# Altium integrated library Rotary_Switches_rev15a.intlib: 52 symbols
Pins are listed as number, name and electrical type; pins without a type are passive.

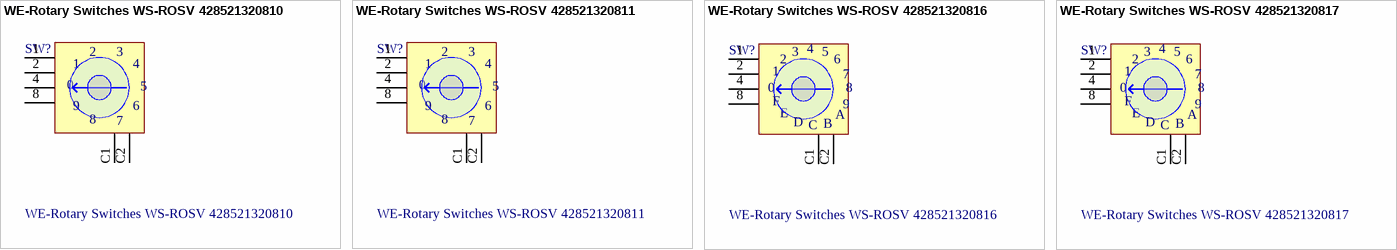
[diagram p0: symbols WE-Rotary Switches WS-ROSV 428521320810 to WE-Rotary Switches WS-ROSV 428521320817]

## WE-Rotary Switches WS-ROSV 428521320810
designator SW?
WS-ROSV SMD Rotary Switch 10x10 mm; Manufacturer: Würth Elektronik eiSos GmbH & Co.KG; ComponentLink1 Description: Manufacturer; ComponentLink2 Description: Datasheet; Creat by: Karrer Zheng; NoPins: 06; Creat Date: 20 March February 2014; partNo: 428521320810; ComponentLink1URL: http://www.we-online.com; ComponentLink2URL: http://katalog.we-online.de/em/datasheet/428521320810.pdf
footprint 428521320810 (10 position, 2.54mm Pitch, Horizontal type, SMD, Round Arrow type, light grey actuator, real code, T&R)
pins: 1, 2, 4, 8, C1, C2
text: 3; 0; 5; 9; 6; 7

## WE-Rotary Switches WS-ROSV 428521320811
designator SW?
WS-ROSV SMD Rotary Switch 10x10 mm; Manufacturer: Würth Elektronik eiSos GmbH & Co.KG; ComponentLink1 Description: Manufacturer; ComponentLink2 Description: Datasheet; Creat by: Karrer Zheng; NoPins: 06; Creat Date: 20 March February 2014; partNo: 428521320811; ComponentLink1URL: http://www.we-online.com; ComponentLink2URL: http://katalog.we-online.de/em/datasheet/428521320811.pdf
footprint 428521320811 (10 position, 2.54mm Pitch, Horizontal type, SMD, Round Arrow type, blue actuator, complement code, T&R)
pins: 1, 2, 4, 8, C1, C2
text: 3; 0; 5; 9; 6; 7

## WE-Rotary Switches WS-ROSV 428521320816
designator SW?
WS-ROSV SMD Rotary Switch 10x10 mm; Manufacturer: Würth Elektronik eiSos GmbH & Co.KG; ComponentLink1 Description: Manufacturer; ComponentLink2 Description: Datasheet; Creat by: Karrer Zheng; NoPins: 06; Creat Date: 20 March February 2014; partNo: 428521320816; ComponentLink1URL: http://www.we-online.com; ComponentLink2URL: http://katalog.we-online.de/em/datasheet/428521320816.pdf
footprint 428521320816 (16 position, 2.54mm Pitch, Horizontal type, SMD, Round Arrow)
pins: 1, 2, 4, 8, C1, C2
text: 3; 5; 6; 7; 0; F; 9; E; A; D; C; B

## WE-Rotary Switches WS-ROSV 428521320817
designator SW?
WS-ROSV SMD Rotary Switch 10x10 mm; Manufacturer: Würth Elektronik eiSos GmbH & Co.KG; ComponentLink1 Description: Manufacturer; ComponentLink2 Description: Datasheet; Creat by: Karrer Zheng; NoPins: 06; Creat Date: 20 March February 2014; partNo: 428521320817; ComponentLink1URL: http://www.we-online.com; ComponentLink2URL: http://katalog.we-online.de/em/datasheet/428521320817.pdf
footprint 428521320817 (16 position, 2.54mm Pitch, Horizontal type, SMD, Round Arrow type, blue actuator, complement code, T&R)
pins: 1, 2, 4, 8, C1, C2
text: 3; 5; 6; 7; 0; F; 9; E; A; D; C; B


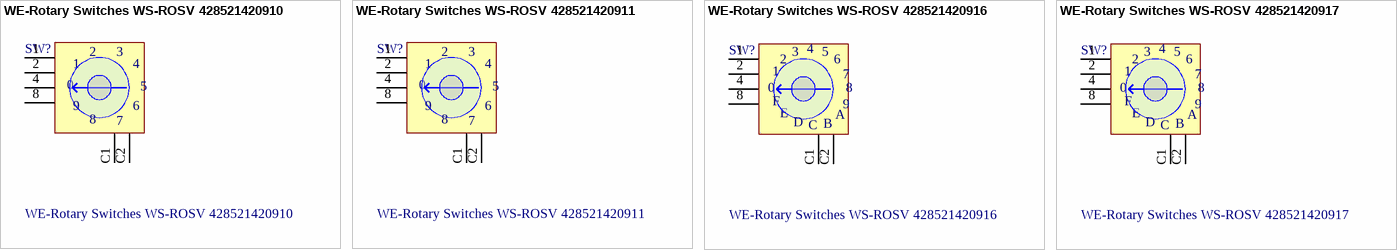
[diagram p1: symbols WE-Rotary Switches WS-ROSV 428521420910 to WE-Rotary Switches WS-ROSV 428521420917]

## WE-Rotary Switches WS-ROSV 428521420910
designator SW?
WS-ROSV SMD Rotary Switch 10x10 mm; Manufacturer: Würth Elektronik eiSos GmbH & Co.KG; ComponentLink1 Description: Manufacturer; ComponentLink2 Description: Datasheet; Creat by: Karrer Zheng; NoPins: 06; Creat Date: 20 March February 2014; partNo: 428521420910; ComponentLink1URL: http://www.we-online.com; ComponentLink2URL: http://katalog.we-online.de/em/datasheet/428521420910.pdf
footprint 428521420910 (10 position, 2.54mm Pitch, Horizontal type, SMD, Round Shaft type, light grey actuator, real code, Tube)
pins: 1, 2, 4, 8, C1, C2
text: 3; 0; 5; 9; 6; 7

## WE-Rotary Switches WS-ROSV 428521420911
designator SW?
WS-ROSV SMD Rotary Switch 10x10 mm; Manufacturer: Würth Elektronik eiSos GmbH & Co.KG; ComponentLink1 Description: Manufacturer; ComponentLink2 Description: Datasheet; Creat by: Karrer Zheng; NoPins: 06; Creat Date: 20 March February 2014; partNo: 428521420911; ComponentLink1URL: http://www.we-online.com; ComponentLink2URL: http://katalog.we-online.de/em/datasheet/428521420911.pdf
footprint 428521420911 (10 position, 2.54mm Pitch, Horizontal type, SMD, Round Shaft type, blue actuator, complement code,Tube)
pins: 1, 2, 4, 8, C1, C2
text: 3; 0; 5; 9; 6; 7

## WE-Rotary Switches WS-ROSV 428521420916
designator SW?
WS-ROSV SMD Rotary Switch 10x10 mm; Manufacturer: Würth Elektronik eiSos GmbH & Co.KG; ComponentLink1 Description: Manufacturer; ComponentLink2 Description: Datasheet; Creat by: Karrer Zheng; NoPins: 06; Creat Date: 20 March February 2014; partNo: 428521420916; ComponentLink1URL: http://www.we-online.com; ComponentLink2URL: http://katalog.we-online.de/em/datasheet/428521420916.pdf
footprint 428521420916 (16 position, 2.54mm Pitch, Horizontal type, SMD, Round Shaft type, light grey actuator, real code, Tube)
pins: 1, 2, 4, 8, C1, C2
text: 3; 5; 6; 7; 0; F; 9; E; A; D; C; B

## WE-Rotary Switches WS-ROSV 428521420917
designator SW?
WS-ROSV SMD Rotary Switch 10x10 mm; Manufacturer: Würth Elektronik eiSos GmbH & Co.KG; ComponentLink1 Description: Manufacturer; ComponentLink2 Description: Datasheet; Creat by: Karrer Zheng; NoPins: 06; Creat Date: 20 March February 2014; partNo: 428521420917; ComponentLink1URL: http://www.we-online.com; ComponentLink2URL: http://katalog.we-online.de/em/datasheet/428521420917.pdf
footprint 428521420917 (16 position, 2.54mm Pitch, Horizontal type, SMD, Round Shaft type, blue actuator, complement code, Tube)
pins: 1, 2, 4, 8, C1, C2
text: 3; 5; 6; 7; 0; F; 9; E; A; D; C; B


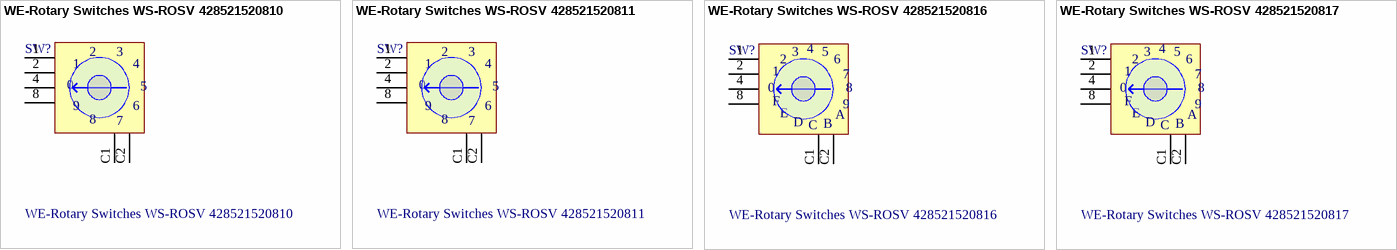
[diagram p2: symbols WE-Rotary Switches WS-ROSV 428521520810 to WE-Rotary Switches WS-ROSV 428521520817]

## WE-Rotary Switches WS-ROSV 428521520810
designator SW?
WS-ROSV SMD Rotary Switch 10x10 mm; Manufacturer: Würth Elektronik eiSos GmbH & Co.KG; ComponentLink1 Description: Manufacturer; ComponentLink2 Description: Datasheet; Creat by: Karrer Zheng; NoPins: 06; Creat Date: 20 March February 2014; partNo: 428521520810; ComponentLink1URL: http://www.we-online.com; ComponentLink2URL: http://katalog.we-online.de/em/datasheet/428521520810.pdf
footprint 428521520810 (10 position, 2.54mm Pitch, Horizontal type, SMD, Round Cross type, light grey actuator, real code, T&R)
pins: 1, 2, 4, 8, C1, C2
text: 3; 0; 5; 9; 6; 7

## WE-Rotary Switches WS-ROSV 428521520811
designator SW?
WS-ROSV SMD Rotary Switch 10x10 mm; Manufacturer: Würth Elektronik eiSos GmbH & Co.KG; ComponentLink1 Description: Manufacturer; ComponentLink2 Description: Datasheet; Creat by: Karrer Zheng; NoPins: 06; Creat Date: 20 March February 2014; partNo: 428521520811; ComponentLink1URL: http://www.we-online.com; ComponentLink2URL: http://katalog.we-online.de/em/datasheet/428521520811.pdf
footprint 428521520811 (10 position, 2.54mm Pitch, Horizontal type, SMD, Round Cross type, blue actuator, complement code, T&R)
pins: 1, 2, 4, 8, C1, C2
text: 3; 0; 5; 9; 6; 7

## WE-Rotary Switches WS-ROSV 428521520816
designator SW?
WS-ROSV SMD Rotary Switch 10x10 mm; Manufacturer: Würth Elektronik eiSos GmbH & Co.KG; ComponentLink1 Description: Manufacturer; ComponentLink2 Description: Datasheet; Creat by: Karrer Zheng; NoPins: 06; Creat Date: 20 March February 2014; partNo: 428521520816; ComponentLink1URL: http://www.we-online.com; ComponentLink2URL: http://katalog.we-online.de/em/datasheet/428521520816.pdf
footprint 428521520816 (16 position, 2.54mm Pitch, Horizontal type, SMD, Round Cross type, light grey actuator, real code, T&R)
pins: 1, 2, 4, 8, C1, C2
text: 3; 5; 6; 7; 0; F; 9; E; A; D; C; B

## WE-Rotary Switches WS-ROSV 428521520817
designator SW?
WS-ROSV SMD Rotary Switch 10x10 mm; Manufacturer: Würth Elektronik eiSos GmbH & Co.KG; ComponentLink1 Description: Manufacturer; ComponentLink2 Description: Datasheet; Creat by: Karrer Zheng; NoPins: 06; Creat Date: 20 March February 2014; partNo: 428521520817; ComponentLink1URL: http://www.we-online.com; ComponentLink2URL: http://katalog.we-online.de/em/datasheet/428521520817.pdf
footprint 428521520817 (16 position, 2.54mm Pitch, Horizontal type, SMD, Round Cross type, blue actuator, complement code, T&R)
pins: 1, 2, 4, 8, C1, C2
text: 3; 5; 6; 7; 0; F; 9; E; A; D; C; B


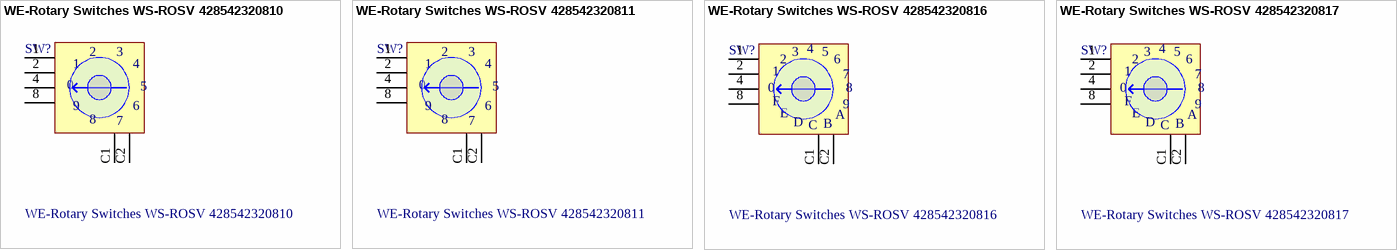
[diagram p3: symbols WE-Rotary Switches WS-ROSV 428542320810 to WE-Rotary Switches WS-ROSV 428542320817]

## WE-Rotary Switches WS-ROSV 428542320810
designator SW?
WS-ROSV SMD Rotary Switch 7 x 7 mm; Manufacturer: Würth Elektronik eiSos GmbH & Co.KG; ComponentLink1 Description: Manufacturer; ComponentLink2 Description: Datasheet; Creat by: Karrer Zheng; NoPins: 06; Creat Date: 24 March 2014; partNo: 428542320810; ComponentLink1URL: http://www.we-online.com; ComponentLink2URL: http://katalog.we-online.de/em/datasheet/428542320810.pdf
footprint 428542320810 (7*7mm, 10 position, 2.54mm Pitch, Horizontal type, SMD, Round Arrow type, red actuator, real code, T&R)
pins: 1, 2, 4, 8, C1, C2
text: 3; 0; 5; 9; 6; 7

## WE-Rotary Switches WS-ROSV 428542320811
designator SW?
WS-ROSV SMD Rotary Switch 7 x 7 mm; Manufacturer: Würth Elektronik eiSos GmbH & Co.KG; ComponentLink1 Description: Manufacturer; ComponentLink2 Description: Datasheet; Creat by: Karrer Zheng; NoPins: 06; Creat Date: 24 March 2014; partNo: 428542320811; ComponentLink1URL: http://www.we-online.com; ComponentLink2URL: http://katalog.we-online.de/em/datasheet/428542320811.pdf
footprint 428542320811 (7*7mm, 10 position, 2.54mm, horizontal type, SMD, Round  Arrow type, orange actuator, complement code, T&R)
pins: 1, 2, 4, 8, C1, C2
text: 3; 0; 5; 9; 6; 7

## WE-Rotary Switches WS-ROSV 428542320816
designator SW?
WS-ROSV SMD Rotary Switch 7 x 7 mm; Manufacturer: Würth Elektronik eiSos GmbH & Co.KG; ComponentLink1 Description: Manufacturer; ComponentLink2 Description: Datasheet; Creat by: Karrer Zheng; NoPins: 06; Creat Date: 24 March 2014; partNo: 428542320816; ComponentLink1URL: http://www.we-online.com; ComponentLink2URL: http://katalog.we-online.de/em/datasheet/428542320816.pdf
footprint 428542320816 (7*7mm, 16 position, 2.54mm, horizontal type, SMD, Round  Arrow type, light grey actuator, real code, T&R)
pins: 1, 2, 4, 8, C1, C2
text: 3; 5; 6; 7; 0; F; 9; E; A; D; C; B

## WE-Rotary Switches WS-ROSV 428542320817
designator SW?
WS-ROSV SMD Rotary Switch 7 x 7 mm; Manufacturer: Würth Elektronik eiSos GmbH & Co.KG; ComponentLink1 Description: Manufacturer; ComponentLink2 Description: Datasheet; Creat by: Karrer Zheng; NoPins: 06; Creat Date: 24 March 2014; partNo: 428542320817; ComponentLink1URL: http://www.we-online.com; ComponentLink2URL: http://katalog.we-online.de/em/datasheet/428542320817.pdf
footprint 428542320817 (7*7mm, 16 position, 2.54mm Pitch, Horizontal type, SMD, Round Arrow type, ivory actuator, complement code, T&R)
pins: 1, 2, 4, 8, C1, C2
text: 3; 5; 6; 7; 0; F; 9; E; A; D; C; B


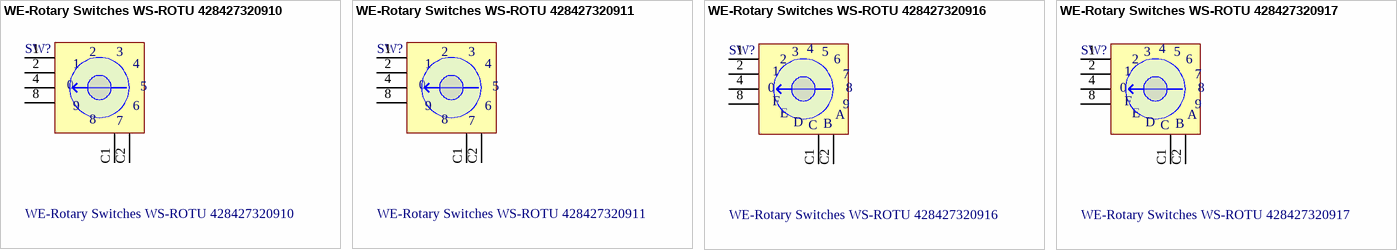
[diagram p4: symbols WE-Rotary Switches WS-ROTU 428427320910 to WE-Rotary Switches WS-ROTU 428427320917]

## WE-Rotary Switches WS-ROTU 428427320910
designator SW?
WS-ROTU THT Rotary Switch 10x10 mm right angle, 2.54 mm Pitch; Manufacturer: Würth Elektronik eiSos GmbH & Co.KG; ComponentLink1 Description: Manufacturer; ComponentLink2 Description: Datasheet; Creat by: Karrer Zheng; NoPins: 06; Creat Date: 24 March 2014; partNo: 428427320910; ComponentLink1URL: http://www.we-online.com; ComponentLink2URL: http://katalog.we-online.de/em/datasheet/428427320910.pdf
footprint 428427320910 (10 position, 2,54mm Pitch, Right Angled type, THT, Round Arrow type, dark grey actuator,real code, Tube)
pins: 1, 2, 4, 8, C1, C2
text: 3; 0; 5; 9; 6; 7

## WE-Rotary Switches WS-ROTU 428427320911
designator SW?
WS-ROTU THT Rotary Switch 10x10 mm right angle,2.54  mm Pitch; Manufacturer: Würth Elektronik eiSos GmbH & Co.KG; ComponentLink1 Description: Manufacturer; ComponentLink2 Description: Datasheet; Creat by: Karrer Zheng; NoPins: 06; Creat Date: 24 March 2014; partNo: 428427320911; ComponentLink1URL: http://www.we-online.com; ComponentLink2URL: http://katalog.we-online.de/em/datasheet/428427320911.pdf
footprint 428427320911 (10 position, 2,54mm Pitch, Right Angled type, THT, Round Arrow type, ivory actuator,complement code, Tube)
pins: 1, 2, 4, 8, C1, C2
text: 3; 0; 5; 9; 6; 7

## WE-Rotary Switches WS-ROTU 428427320916
designator SW?
WS-ROTU THT Rotary Switch 10x10 mm right angle,2.54 mm Pitch; Manufacturer: Würth Elektronik eiSos GmbH & Co.KG; ComponentLink1 Description: Manufacturer; ComponentLink2 Description: Datasheet; Creat by: Karrer Zheng; NoPins: 06; Creat Date: 24 March 2014; partNo: 428427320916; ComponentLink1URL: http://www.we-online.com; ComponentLink2URL: http://katalog.we-online.de/em/datasheet/428427320916.pdf
footprint 428427320916 (16 position, 2,54mm Pitch, Right Angled type, THT, Round Arrow type, dark grey actuator,real code, Tube)
pins: 1, 2, 4, 8, C1, C2
text: 3; 5; 6; 7; 0; F; 9; E; A; D; C; B

## WE-Rotary Switches WS-ROTU 428427320917
designator SW?
WS-ROTU THT Rotary Switch 10x10 mm right angle,2.54 mm Pitch; Manufacturer: Würth Elektronik eiSos GmbH & Co.KG; ComponentLink1 Description: Manufacturer; ComponentLink2 Description: Datasheet; Creat by: Karrer Zheng; NoPins: 06; Creat Date: 24 March 2014; partNo: 428427320917; ComponentLink1URL: http://www.we-online.com; ComponentLink2URL: http://katalog.we-online.de/em/datasheet/428427320917.pdf
footprint 428427320917 (16 position, 2,54mm Pitch, Right Angled type, THT, Round Arrow type, ivory actuator,complement code, Tube)
pins: 1, 2, 4, 8, C1, C2
text: 3; 5; 6; 7; 0; F; 9; E; A; D; C; B


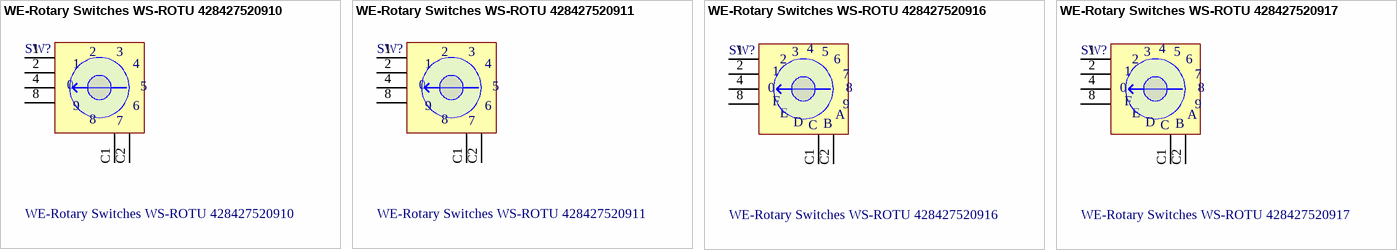
[diagram p5: symbols WE-Rotary Switches WS-ROTU 428427520910 to WE-Rotary Switches WS-ROTU 428427520917]

## WE-Rotary Switches WS-ROTU 428427520910
designator SW?
WS-ROTU THT Rotary Switch 10x10 mm right angle, 2.54 mm Pitch; Manufacturer: Würth Elektronik eiSos GmbH & Co.KG; ComponentLink1 Description: Manufacturer; ComponentLink2 Description: Datasheet; Creat by: Karrer Zheng; NoPins: 06; Creat Date: 24 March 2014; partNo: 428427520910; ComponentLink1URL: http://www.we-online.com; ComponentLink2URL: http://katalog.we-online.de/em/datasheet/428427520910.pdf
footprint 428427520910 (10 position, 2,54mm Pitch, Right Angled type, THT, Round Cross type, dark grey actuator,real code, Tube)
pins: 1, 2, 4, 8, C1, C2
text: 3; 0; 5; 9; 6; 7

## WE-Rotary Switches WS-ROTU 428427520911
designator SW?
WS-ROTU THT Rotary Switch 10x10 mm right angle, 2.54 mm Pitch; Manufacturer: Würth Elektronik eiSos GmbH & Co.KG; ComponentLink1 Description: Manufacturer; ComponentLink2 Description: Datasheet; Creat by: Karrer Zheng; NoPins: 06; Creat Date: 24 March 2014; partNo: 428427520911; ComponentLink1URL: http://www.we-online.com; ComponentLink2URL: http://katalog.we-online.de/em/datasheet/428427520911.pdf
footprint 428427520911 (10 position, 2,54mm Pitch, Right Angled type, THT, Round Cross type, ivory actuator,complement code, Tube)
pins: 1, 2, 4, 8, C1, C2
text: 3; 0; 5; 9; 6; 7

## WE-Rotary Switches WS-ROTU 428427520916
designator SW?
WS-ROTU THT Rotary Switch 10x10 mm right angle, 2.54 mm Pitch; Manufacturer: Würth Elektronik eiSos GmbH & Co.KG; ComponentLink1 Description: Manufacturer; ComponentLink2 Description: Datasheet; Creat by: Karrer Zheng; NoPins: 06; Creat Date: 24 March 2014; partNo: 428427520916; ComponentLink1URL: http://www.we-online.com; ComponentLink2URL: http://katalog.we-online.de/em/datasheet/428427520916.pdf
footprint 428427520916 (16 position, 2,54mm Pitch, Right Angled type, THT, Round Cross type, dark grey actuator,real code, Tube)
pins: 1, 2, 4, 8, C1, C2
text: 3; 5; 6; 7; 0; F; 9; E; A; D; C; B

## WE-Rotary Switches WS-ROTU 428427520917
designator SW?
WS-ROTU THT Rotary Switch 10x10 mm right angle, 2.54 mm Pitch; Manufacturer: Würth Elektronik eiSos GmbH & Co.KG; ComponentLink1 Description: Manufacturer; ComponentLink2 Description: Datasheet; Creat by: Karrer Zheng; NoPins: 06; Creat Date: 24 March 2014; partNo: 428427520917; ComponentLink1URL: http://www.we-online.com; ComponentLink2URL: http://katalog.we-online.de/em/datasheet/428427520917.pdf
footprint 428427520917 (16 position, 2,54mm Pitch, Right Angled type, THT, Round Cross type, ivory actuator,complement code, Tube)
pins: 1, 2, 4, 8, C1, C2
text: 3; 5; 6; 7; 0; F; 9; E; A; D; C; B


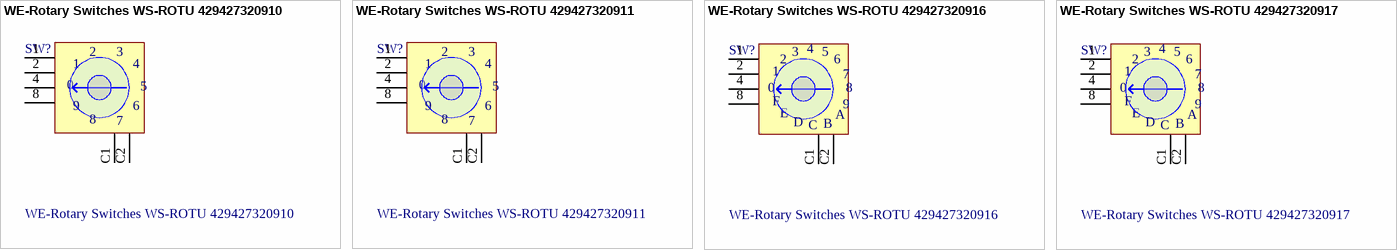
[diagram p6: symbols WE-Rotary Switches WS-ROTU 429427320910 to WE-Rotary Switches WS-ROTU 429427320917]

## WE-Rotary Switches WS-ROTU 429427320910
designator SW?
WS-ROTU THT Rotary Switch 10x10 mm; Manufacturer: Würth Elektronik eiSos GmbH & Co.KG; ComponentLink1 Description: Manufacturer; ComponentLink2 Description: Datasheet; Creat by: Karrer Zheng; NoPins: 06; Creat Date: 24 March 2014; partNo: 429427320910; ComponentLink1URL: http://www.we-online.com; ComponentLink2URL: http://katalog.we-online.de/em/datasheet/429427320910.pdf
footprint 429427320910 (10 position, 5,08mm Pitch, Right Angled type, THT, Round Arrow type, dark grey actuator, real code, Tube)
pins: 1, 2, 4, 8, C1, C2
text: 3; 0; 5; 9; 6; 7

## WE-Rotary Switches WS-ROTU 429427320911
designator SW?
WS-ROTU THT Rotary Switch 10x10 mm; Manufacturer: Würth Elektronik eiSos GmbH & Co.KG; ComponentLink1 Description: Manufacturer; ComponentLink2 Description: Datasheet; Creat by: Karrer Zheng; NoPins: 06; Creat Date: 24 March 2014; partNo: 429427320911; ComponentLink1URL: http://www.we-online.com; ComponentLink2URL: http://katalog.we-online.de/em/datasheet/429427320911.pdf
footprint 429427320911 (10 position, 5,08mm Pitch, Right Angled type, THT, Round Arrow type, ivory actuator, complement code, Tube)
pins: 1, 2, 4, 8, C1, C2
text: 3; 0; 5; 9; 6; 7

## WE-Rotary Switches WS-ROTU 429427320916
designator SW?
WS-ROTU THT Rotary Switch 10x10 mm; Manufacturer: Würth Elektronik eiSos GmbH & Co.KG; ComponentLink1 Description: Manufacturer; ComponentLink2 Description: Datasheet; Creat by: Karrer Zheng; NoPins: 06; Creat Date: 24 March 2014; partNo: 429427320916; ComponentLink1URL: http://www.we-online.com; ComponentLink2URL: http://katalog.we-online.de/em/datasheet/429427320916.pdf
footprint 429427320916 (16 position, 5,08mm Pitch, Right Angled type, THT, Round Arrow type, dark grey actuator, real code, Tube)
pins: 1, 2, 4, 8, C1, C2
text: 3; 5; 6; 7; 0; F; 9; E; A; D; C; B

## WE-Rotary Switches WS-ROTU 429427320917
designator SW?
WS-ROTU THT Rotary Switch 10x10 mm; Manufacturer: Würth Elektronik eiSos GmbH & Co.KG; ComponentLink1 Description: Manufacturer; ComponentLink2 Description: Datasheet; Creat by: Karrer Zheng; NoPins: 06; Creat Date: 24 March 2014; partNo: 429427320917; ComponentLink1URL: http://www.we-online.com; ComponentLink2URL: http://katalog.we-online.de/em/datasheet/429427320917.pdf
footprint 429427320917 (16 position, 5,08mm Pitch, Right Angled type, THT, Round Arrow type, ivory actuator, complement code, Tube)
pins: 1, 2, 4, 8, C1, C2
text: 3; 5; 6; 7; 0; F; 9; E; A; D; C; B


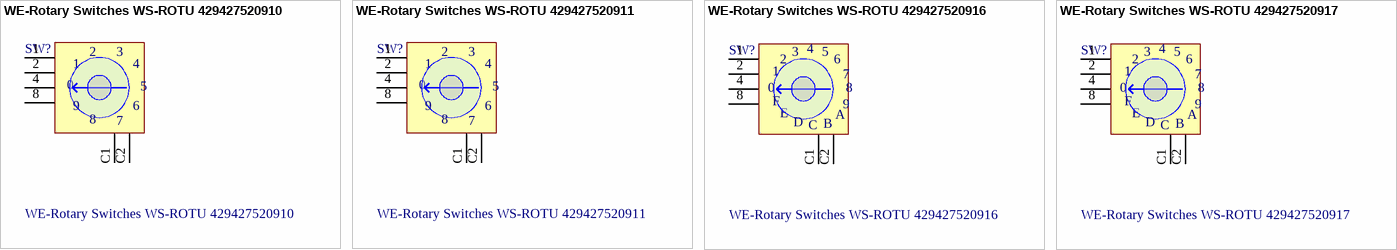
[diagram p7: symbols WE-Rotary Switches WS-ROTU 429427520910 to WE-Rotary Switches WS-ROTU 429427520917]

## WE-Rotary Switches WS-ROTU 429427520910
designator SW?
WS-ROTU THT Rotary Switch 10x10 mm right angle, 5.08 mm Pitch; Manufacturer: Würth Elektronik eiSos GmbH & Co.KG; ComponentLink1 Description: Manufacturer; ComponentLink2 Description: Datasheet; Creat by: Karrer Zheng; NoPins: 06; Creat Date: 24 March 2014; partNo: 429427520910; ComponentLink1URL: http://www.we-online.com; ComponentLink2URL: http://katalog.we-online.de/em/datasheet/429427520910.pdf
footprint 429427520910 (10 position, 5,08mm Pitch, Right Angled type, THT, Round Cross type, dark grey actuator, real code, Tube)
pins: 1, 2, 4, 8, C1, C2
text: 3; 0; 5; 9; 6; 7

## WE-Rotary Switches WS-ROTU 429427520911
designator SW?
WS-ROTU THT Rotary Switch 10x10 mm right angle, 5.08 mm Pitch; Manufacturer: Würth Elektronik eiSos GmbH & Co.KG; ComponentLink1 Description: Manufacturer; ComponentLink2 Description: Datasheet; Creat by: Karrer Zheng; NoPins: 06; Creat Date: 24 March 2014; partNo: 429427520911; ComponentLink1URL: http://www.we-online.com; ComponentLink2URL: http://katalog.we-online.de/em/datasheet/429427520911.pdf
footprint 429427520911 (10 position, 5,08mm Pitch, Right Angled type, THT, Round Cross type, ivory actuator, complement code, Tube)
pins: 1, 2, 4, 8, C1, C2
text: 3; 0; 5; 9; 6; 7

## WE-Rotary Switches WS-ROTU 429427520916
designator SW?
WS-ROTU THT Rotary Switch 10x10 mm right angle, 5.08 mm Pitch; Manufacturer: Würth Elektronik eiSos GmbH & Co.KG; ComponentLink1 Description: Manufacturer; ComponentLink2 Description: Datasheet; Creat by: Karrer Zheng; NoPins: 06; Creat Date: 24 March 2014; partNo: 429427520916; ComponentLink1URL: http://www.we-online.com; ComponentLink2URL: http://katalog.we-online.de/em/datasheet/429427520916.pdf
footprint 429427520916 (16 position, 5,08mm Pitch, Right Angled type, THT, Round Cross type, dark grey actuator, real code, Tube)
pins: 1, 2, 4, 8, C1, C2
text: 3; 5; 6; 7; 0; F; 9; E; A; D; C; B

## WE-Rotary Switches WS-ROTU 429427520917
designator SW?
WS-ROTU THT Rotary Switch 10x10 mm right angle, 5.08 mm Pitch; Manufacturer: Würth Elektronik eiSos GmbH & Co.KG; ComponentLink1 Description: Manufacturer; ComponentLink2 Description: Datasheet; Creat by: Karrer Zheng; NoPins: 06; Creat Date: 24 March 2014; partNo: 429427520917; ComponentLink1URL: http://www.we-online.com; ComponentLink2URL: http://katalog.we-online.de/em/datasheet/429427520917.pdf
footprint 429427520917 (16 position, 5,08mm Pitch, Right Angled type, THT, Round Cross type, ivory actuator, complement code, Tube)
pins: 1, 2, 4, 8, C1, C2
text: 3; 5; 6; 7; 0; F; 9; E; A; D; C; B


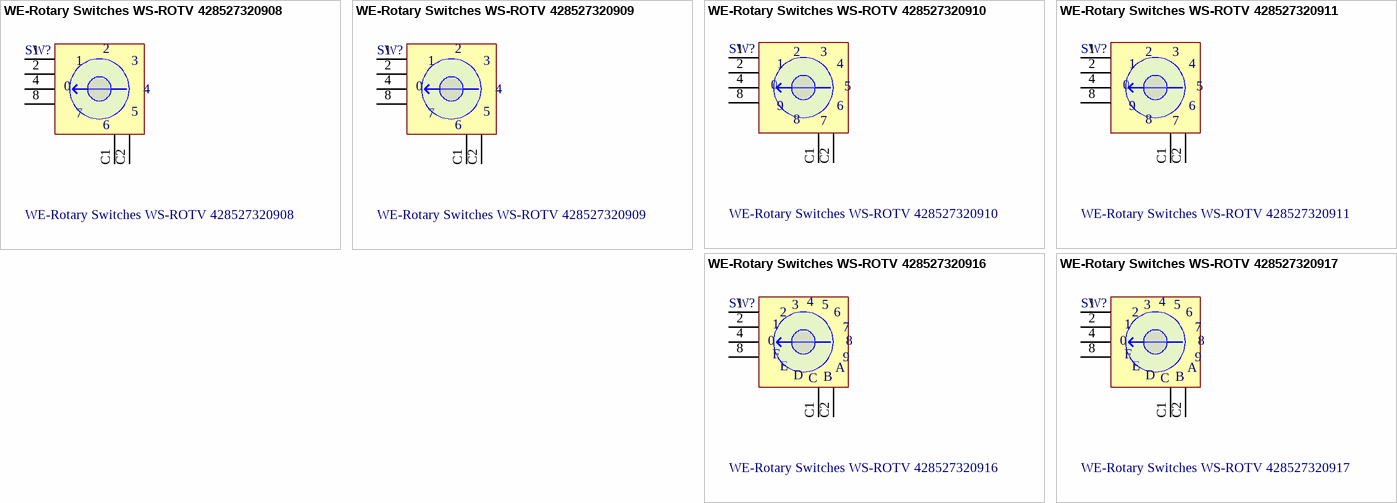
[diagram p8: symbols WE-Rotary Switches WS-ROTV 428527320908 to WE-Rotary Switches WS-ROTV 428527320917]

## WE-Rotary Switches WS-ROTV 428527320908
designator SW?
WS-ROTV THT Rotary Switch 10x10 mm; Manufacturer: Würth Elektronik eiSos GmbH & Co.KG; ComponentLink1 Description: Manufacturer; ComponentLink2 Description: Datasheet; Creat by: Karrer Zheng; NoPins: 06; Creat Date: 20 March February 2014; partNo: 428527320908; ComponentLink1URL: http://www.we-online.com; ComponentLink2URL: http://katalog.we-online.de/em/datasheet/428527320908.pdf
footprint 428527320908
pins: 1, 2, 4, 8, C1, C2
text: 3; 0; 7; 5; 6

## WE-Rotary Switches WS-ROTV 428527320909
designator SW?
WS-ROTV THT Rotary Switch 10x10 mm; Manufacturer: Würth Elektronik eiSos GmbH & Co.KG; ComponentLink1 Description: Manufacturer; ComponentLink2 Description: Datasheet; Creat by: Karrer Zheng; NoPins: 06; Creat Date: 20 March February 2014; partNo: 428527320909; ComponentLink1URL: http://www.we-online.com; ComponentLink2URL: http://katalog.we-online.de/em/datasheet/428527320909.pdf
footprint 428527320909
pins: 1, 2, 4, 8, C1, C2
text: 3; 0; 7; 5; 6

## WE-Rotary Switches WS-ROTV 428527320910
designator SW?
WS-ROTV THT Rotary Switch 10x10 mm; Manufacturer: Würth Elektronik eiSos GmbH & Co.KG; ComponentLink1 Description: Manufacturer; ComponentLink2 Description: Datasheet; Creat by: Karrer Zheng; NoPins: 06; Creat Date: 20 March February 2014; partNo: 428527320910; ComponentLink1URL: http://www.we-online.com; ComponentLink2URL: http://katalog.we-online.de/em/datasheet/428527320910.pdf
footprint 428527320910
pins: 1, 2, 4, 8, C1, C2
text: 3; 0; 5; 9; 6; 7

## WE-Rotary Switches WS-ROTV 428527320911
designator SW?
WS-ROTV THT Rotary Switch 10x10 mm; Manufacturer: Würth Elektronik eiSos GmbH & Co.KG; ComponentLink1 Description: Manufacturer; ComponentLink2 Description: Datasheet; Creat by: Karrer Zheng; NoPins: 06; Creat Date: 20 March February 2014; partNo: 428527320911; ComponentLink1URL: http://www.we-online.com; ComponentLink2URL: http://katalog.we-online.de/em/datasheet/428527320911.pdf
footprint 428527320911
pins: 1, 2, 4, 8, C1, C2
text: 3; 0; 5; 9; 6; 7

## WE-Rotary Switches WS-ROTV 428527320916
designator SW?
WS-ROTV THT Rotary Switch 10x10 mm; Manufacturer: Würth Elektronik eiSos GmbH & Co.KG; ComponentLink1 Description: Manufacturer; ComponentLink2 Description: Datasheet; Creat by: Karrer Zheng; NoPins: 06; Creat Date: 20 March February 2014; partNo: 428527320916; ComponentLink1URL: http://www.we-online.com; ComponentLink2URL: http://katalog.we-online.de/em/datasheet/428527320916.pdf
footprint 428527320916
pins: 1, 2, 4, 8, C1, C2
text: 3; 5; 6; 7; 0; F; 9; E; A; D; C; B

## WE-Rotary Switches WS-ROTV 428527320917
designator SW?
WS-ROTV THT Rotary Switch 10x10 mm; Manufacturer: Würth Elektronik eiSos GmbH & Co.KG; ComponentLink1 Description: Manufacturer; ComponentLink2 Description: Datasheet; Creat by: Karrer Zheng; NoPins: 06; Creat Date: 20 March February 2014; partNo: 428527320917; ComponentLink1URL: http://www.we-online.com; ComponentLink2URL: http://katalog.we-online.de/em/datasheet/428527320917.pdf
footprint 428527320917
pins: 1, 2, 4, 8, C1, C2
text: 3; 5; 6; 7; 0; F; 9; E; A; D; C; B


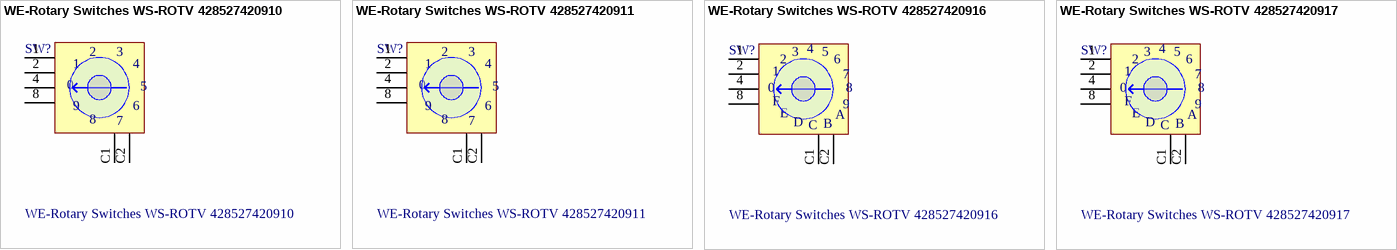
[diagram p9: symbols WE-Rotary Switches WS-ROTV 428527420910 to WE-Rotary Switches WS-ROTV 428527420917]

## WE-Rotary Switches WS-ROTV 428527420910
designator SW?
WS-ROTV THT Rotary Switch 10x10 mm; Manufacturer: Würth Elektronik eiSos GmbH & Co.KG; ComponentLink1 Description: Manufacturer; ComponentLink2 Description: Datasheet; Creat by: Karrer Zheng; NoPins: 06; Creat Date: 24 March 2014; partNo: 428527420910; ComponentLink1URL: http://www.we-online.com; ComponentLink2URL: http://katalog.we-online.de/em/datasheet/428527420910.pdf
footprint 428527420910 (10 position, 2.54mm Pitch, Horizontal type, THT, Round Shaft type, dark grey actuator, real code, Tube)
pins: 1, 2, 4, 8, C1, C2
text: 3; 0; 5; 9; 6; 7

## WE-Rotary Switches WS-ROTV 428527420911
designator SW?
WS-ROTV THT Rotary Switch 10x10 mm; Manufacturer: Würth Elektronik eiSos GmbH & Co.KG; ComponentLink1 Description: Manufacturer; ComponentLink2 Description: Datasheet; Creat by: Karrer Zheng; NoPins: 06; Creat Date: 24 March 2014; partNo: 428527420911; ComponentLink1URL: http://www.we-online.com; ComponentLink2URL: http://katalog.we-online.de/em/datasheet/428527420911.pdf
footprint 428527420911 (10 position, 2.54mm Pitch, Horizontal type, THT, Round Shaft type, ivory actuator, complement code, Tube)
pins: 1, 2, 4, 8, C1, C2
text: 3; 0; 5; 9; 6; 7

## WE-Rotary Switches WS-ROTV 428527420916
designator SW?
WS-ROTV THT Rotary Switch 10x10 mm; Manufacturer: Würth Elektronik eiSos GmbH & Co.KG; ComponentLink1 Description: Manufacturer; ComponentLink2 Description: Datasheet; Creat by: Karrer Zheng; NoPins: 06; Creat Date: 24 March 2014; partNo: 428527420916; ComponentLink1URL: http://www.we-online.com; ComponentLink2URL: http://katalog.we-online.de/em/datasheet/428527420916.pdf
footprint 428527420916 (16 position, 2.54mm Pitch, Horizontal type, THT, Round Shaft type, dark grey actuator, real code, Tube)
pins: 1, 2, 4, 8, C1, C2
text: 3; 5; 6; 7; 0; F; 9; E; A; D; C; B

## WE-Rotary Switches WS-ROTV 428527420917
designator SW?
WS-ROTV THT Rotary Switch 10x10 mm; Manufacturer: Würth Elektronik eiSos GmbH & Co.KG; ComponentLink1 Description: Manufacturer; ComponentLink2 Description: Datasheet; Creat by: Karrer Zheng; NoPins: 06; Creat Date: 24 March 2014; partNo: 428527420917; ComponentLink1URL: http://www.we-online.com; ComponentLink2URL: http://katalog.we-online.de/em/datasheet/428527420917.pdf
footprint 428527420917 (16 position, 2.54mm Pitch, Horizontal type, THT, Round Shaft type, ivory actuator, complement code, Tube)
pins: 1, 2, 4, 8, C1, C2
text: 3; 5; 6; 7; 0; F; 9; E; A; D; C; B


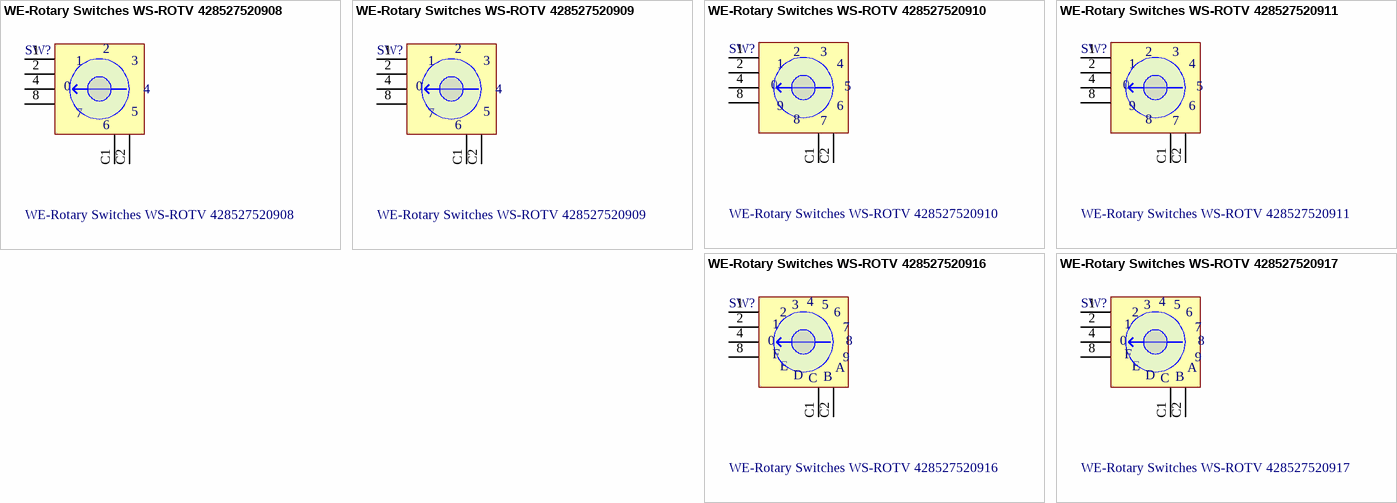
[diagram p10: symbols WE-Rotary Switches WS-ROTV 428527520908 to WE-Rotary Switches WS-ROTV 428527520917]

## WE-Rotary Switches WS-ROTV 428527520908
designator SW?
WS-ROTV THT Rotary Switch 10x10 mm; Manufacturer: Würth Elektronik eiSos GmbH & Co.KG; ComponentLink1 Description: Manufacturer; ComponentLink2 Description: Datasheet; Creat by: Karrer Zheng; NoPins: 06; Creat Date: 24 March 2014; partNo: 428527520908; ComponentLink1URL: http://www.we-online.com; ComponentLink2URL: http://katalog.we-online.de/em/datasheet/428527520908.pdf
footprint 428527520908 (8 position, 2.54mm Pitch, Horizontal type, THT, Round Cross type, dark grey actuator, real code, Tube)
pins: 1, 2, 4, 8, C1, C2
text: 3; 0; 7; 5; 6

## WE-Rotary Switches WS-ROTV 428527520909
designator SW?
WS-ROTV THT Rotary Switch 10x10 mm; Manufacturer: Würth Elektronik eiSos GmbH & Co.KG; ComponentLink1 Description: Manufacturer; ComponentLink2 Description: Datasheet; Creat by: Karrer Zheng; NoPins: 06; Creat Date: 24 March 2014; partNo: 428527520909; ComponentLink1URL: http://www.we-online.com; ComponentLink2URL: http://katalog.we-online.de/em/datasheet/428527520909.pdf
footprint 428527520909 (8 position, 2.54mm Pitch, Horizontal type, THT, Round Cross type, ivory actuator, complement code, Tube)
pins: 1, 2, 4, 8, C1, C2
text: 3; 0; 7; 5; 6

## WE-Rotary Switches WS-ROTV 428527520910
designator SW?
WS-ROTV THT Rotary Switch 10x10 mm; Manufacturer: Würth Elektronik eiSos GmbH & Co.KG; ComponentLink1 Description: Manufacturer; ComponentLink2 Description: Datasheet; Creat by: Karrer Zheng; NoPins: 06; Creat Date: 24 March 2014; partNo: 428527520910; ComponentLink1URL: http://www.we-online.com; ComponentLink2URL: http://katalog.we-online.de/em/datasheet/428527520910.pdf
footprint 428527520910 (10 position, 2.54mm Pitch, Horizontal type, THT, Round Cross type, dark grey actuator, real code, Tube)
pins: 1, 2, 4, 8, C1, C2
text: 3; 0; 5; 9; 6; 7

## WE-Rotary Switches WS-ROTV 428527520911
designator SW?
WS-ROTV THT Rotary Switch 10x10 mm; Manufacturer: Würth Elektronik eiSos GmbH & Co.KG; ComponentLink1 Description: Manufacturer; ComponentLink2 Description: Datasheet; Creat by: Karrer Zheng; NoPins: 06; Creat Date: 24 March 2014; partNo: 428527520911; ComponentLink1URL: http://www.we-online.com; ComponentLink2URL: http://katalog.we-online.de/em/datasheet/428527520911.pdf
footprint 428527520911 (10 position, 2.54mm Pitch, Horizontal type, THT, Round Cross type, ivory actuator, complement code, Tube)
pins: 1, 2, 4, 8, C1, C2
text: 3; 0; 5; 9; 6; 7

## WE-Rotary Switches WS-ROTV 428527520916
designator SW?
WS-ROTV THT Rotary Switch 10x10 mm; Manufacturer: Würth Elektronik eiSos GmbH & Co.KG; ComponentLink1 Description: Manufacturer; ComponentLink2 Description: Datasheet; Creat by: Karrer Zheng; NoPins: 06; Creat Date: 24 March 2014; partNo: 428527520916; ComponentLink1URL: http://www.we-online.com; ComponentLink2URL: http://katalog.we-online.de/em/datasheet/428527520916.pdf
footprint 428527520916 (16 position, 2.54mm Pitch, Horizontal type, THT, Round Cross  type, dark grey actuator, real code, Tube)
pins: 1, 2, 4, 8, C1, C2
text: 3; 5; 6; 7; 0; F; 9; E; A; D; C; B

## WE-Rotary Switches WS-ROTV 428527520917
designator SW?
WS-ROTV THT Rotary Switch 10x10 mm; Manufacturer: Würth Elektronik eiSos GmbH & Co.KG; ComponentLink1 Description: Manufacturer; ComponentLink2 Description: Datasheet; Creat by: Karrer Zheng; NoPins: 06; Creat Date: 24 March 2014; partNo: 428527520917; ComponentLink1URL: http://www.we-online.com; ComponentLink2URL: http://katalog.we-online.de/em/datasheet/428527520917.pdf
footprint 428527520917 (16 position, 2.54mm Pitch, Horizontal type, THT, Round Cross type, ivory actuator, complement code, Tube)
pins: 1, 2, 4, 8, C1, C2
text: 3; 5; 6; 7; 0; F; 9; E; A; D; C; B


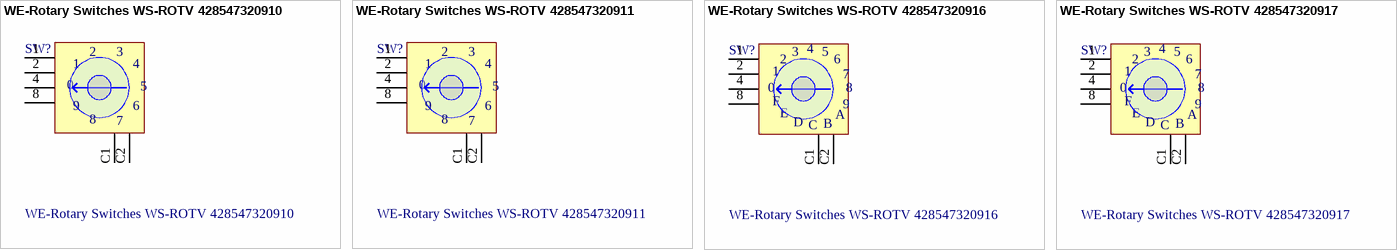
[diagram p11: symbols WE-Rotary Switches WS-ROTV 428547320910 to WE-Rotary Switches WS-ROTV 428547320917]

## WE-Rotary Switches WS-ROTV 428547320910
designator SW?
WS-ROTV THT Rotary Switch 7 x 7 mm; Manufacturer: Würth Elektronik eiSos GmbH & Co.KG; ComponentLink1 Description: Manufacturer; ComponentLink2 Description: Datasheet; Creat by: Karrer Zheng; NoPins: 06; Creat Date: 24 March 2014; partNo: 428547320910; ComponentLink1URL: http://www.we-online.com; ComponentLink2URL: http://katalog.we-online.de/em/datasheet/428547320910.pdf
footprint 428547320910 (7*7mm, 10 position, 2.54mm, horizontal type, THT, Round  Arrow type, red actuator, real code, Tube)
pins: 1, 2, 4, 8, C1, C2
text: 3; 0; 5; 9; 6; 7

## WE-Rotary Switches WS-ROTV 428547320911
designator SW?
WS-ROTV THT Rotary Switch 7 x 7 mm; Manufacturer: Würth Elektronik eiSos GmbH & Co.KG; ComponentLink1 Description: Manufacturer; ComponentLink2 Description: Datasheet; Creat by: Karrer Zheng; NoPins: 06; Creat Date: 24 March 2014; partNo: 428547320911; ComponentLink1URL: http://www.we-online.com; ComponentLink2URL: http://katalog.we-online.de/em/datasheet/428547320911.pdf
footprint 428547320911 (7*7mm, 10 position, 2.54mm, horizontal type, THT, Round  Arrow type, orange actuator, complement code, Tube)
pins: 1, 2, 4, 8, C1, C2
text: 3; 0; 5; 9; 6; 7

## WE-Rotary Switches WS-ROTV 428547320916
designator SW?
WS-ROTV THT Rotary Switch 7 x 7 mm; Manufacturer: Würth Elektronik eiSos GmbH & Co.KG; ComponentLink1 Description: Manufacturer; ComponentLink2 Description: Datasheet; Creat by: Karrer Zheng; NoPins: 06; Creat Date: 24 March 2014; partNo: 428547320916; ComponentLink1URL: http://www.we-online.com; ComponentLink2URL: http://katalog.we-online.de/em/datasheet/428547320916.pdf
footprint 428547320916 (7*7mm, 16 position, 2.54mm, horizontal type, THT, Round  Arrow type, light grey actuator, real code, Tube)
pins: 1, 2, 4, 8, C1, C2
text: 3; 5; 6; 7; 0; F; 9; E; A; D; C; B

## WE-Rotary Switches WS-ROTV 428547320917
designator SW?
WS-ROTV THT Rotary Switch 7 x 7 mm; Manufacturer: Würth Elektronik eiSos GmbH & Co.KG; ComponentLink1 Description: Manufacturer; ComponentLink2 Description: Datasheet; Creat by: Karrer Zheng; NoPins: 06; Creat Date: 24 March 2014; partNo: 428547320917; ComponentLink1URL: http://www.we-online.com; ComponentLink2URL: http://katalog.we-online.de/em/datasheet/428547320917.pdf
footprint 428547320917 (7*7mm, 16 position, 2.54mm, horizontal type, THT, Round  Arrow type, ivory actuator, complement code, Tube)
pins: 1, 2, 4, 8, C1, C2
text: 3; 5; 6; 7; 0; F; 9; E; A; D; C; B